# Altium footprint library Connector.PcbLib: 129 footprints (part 7 of 9)
Each footprint in its own frame and in the unit in brackets; x right, y up, seen from the top. Pads: shape width x height; smd on the part's side, far side on the other; paste and mask are expansions set on the pad; w line width, h text height; cw(c..) or ccw(c..) is an arc to the next point about the centre after c.
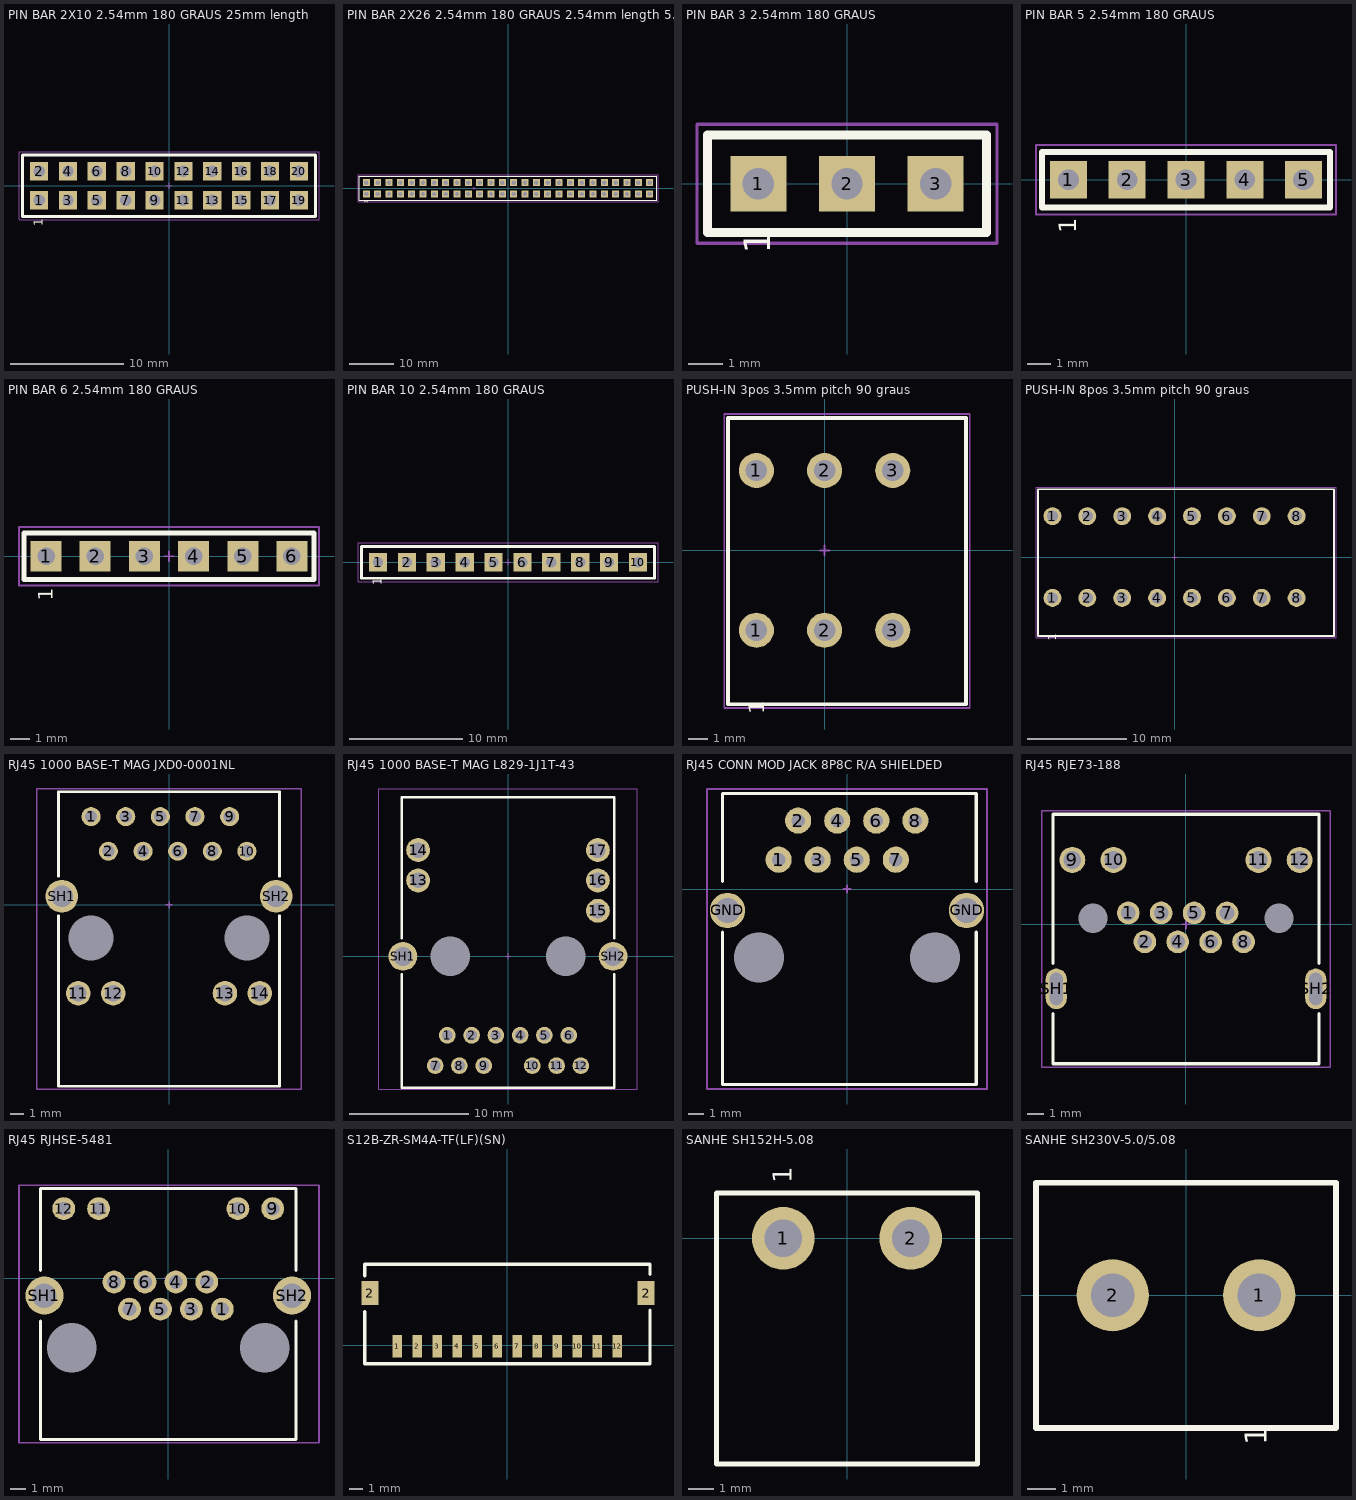
[diagram p6: the footprints below, top view; thin cyan lines are the x and y axes]

## PIN BAR 2X10 2.54mm 180 GRAUS 25mm length [mm] "HEADER 5 2.54mm 180 GRAUS"
height 25
pads (20):
  rect 1.6x1.6 hole 1: 1(-11.43,-1.27) 2(-11.43,1.27) 3(-8.89,-1.27) 4(-8.89,1.27) 5(-6.35,-1.27) 6(-6.35,1.27) 7(-3.81,-1.27) 8(-3.81,1.27) 9(-1.27,-1.27) 10(-1.27,1.27) 11(1.27,-1.27) 12(1.27,1.27) 13(3.81,-1.27) 14(3.81,1.27) 15(6.35,-1.27) 16(6.35,1.27) 17(8.89,-1.27) 18(8.89,1.27) 19(11.43,-1.27) 20(11.43,1.27)
Top Overlay:
  lines w0.254: -12.9,-2.7 -12.9,2.7 12.9,2.7 12.9,-2.7 -12.9,-2.7
  text "1" at -11.09,-3.57 h0.76
Mechanical 15:
  lines w0.1: -0.25,0 0.25,0 ; 0,-0.25 0,0.25 ; -13.2,-3 -13.2,3 13.2,3 13.2,-3 -13.2,-3
3D body "Pin Bar 2X10 2.54mm 25mm length.STEP": height 22.1, standoff -2.9, extent -12.7,-2.55 12.7,2.53

## PIN BAR 2X26 2.54mm 180 GRAUS 2.54mm length 5.84 contacts lenght [mm]
height 8.38
pads (52):
  rect 1.6x1.6 hole 1: 1(-31.75,-1.27) 2(-31.75,1.27) 3(-29.21,-1.27) 4(-29.21,1.27) 5(-26.67,-1.27) 6(-26.67,1.27) 7(-24.13,-1.27) 8(-24.13,1.27) 9(-21.59,-1.27) 10(-21.59,1.27) 11(-19.05,-1.27) 12(-19.05,1.27) 13(-16.51,-1.27) 14(-16.51,1.27) 15(-13.97,-1.27) 16(-13.97,1.27) 17(-11.43,-1.27) 18(-11.43,1.27) 19(-8.89,-1.27) 20(-8.89,1.27) 21(-6.35,-1.27) 22(-6.35,1.27) 23(-3.81,-1.27) 24(-3.81,1.27) 25(-1.27,-1.27) 26(-1.27,1.27) 27(1.27,-1.27) 28(1.27,1.27) 29(3.81,-1.27) 30(3.81,1.27) 31(6.35,-1.27) 32(6.35,1.27) 33(8.89,-1.27) 34(8.89,1.27) 35(11.43,-1.27) 36(11.43,1.27) 37(13.97,-1.27) 38(13.97,1.27) 39(16.51,-1.27) 40(16.51,1.27) 41(19.05,-1.27) 42(19.05,1.27) 43(21.59,-1.27) 44(21.59,1.27) 45(24.13,-1.27) 46(24.13,1.27) 47(26.67,-1.27) 48(26.67,1.27) 49(29.21,-1.27) 50(29.21,1.27) 51(31.75,-1.27) 52(31.75,1.27)
Top Overlay:
  lines w0.254: -33.32,-2.7 -33.32,2.7 33.32,2.7 33.32,-2.7 -33.32,-2.7
  text "1" at -31.4,-3.3 h0.76
Mechanical 15:
  lines w0.1: -7.87,0 -7.37,0 ; -7.62,-0.25 -7.62,0.25 ; -33.62,-3 -33.62,3 33.62,3 33.62,-3 -33.62,-3
3D body "TSW-126-07-G-D.stp": height 8.38, standoff -2.54, extent -33.02,-2.54 33.02,2.54

## PIN BAR 3 2.54mm 180 GRAUS [mm] "PIN BAR 3 2.54mm 180 GRAUS"
height 8.64
pads (3):
  rect 1.6x1.6 hole 0.9: 1(-2.54,0) 2(0,0) 3(2.54,0)
Top Overlay:
  lines w0.254: -4,-1.4 -4,1.4 4,1.4 4,-1.4 -4,-1.4
  text "1" at -2.2,-2 h0.76
Mechanical 15:
  lines w0.1: -0.25,0 0.25,0 ; 0,-0.25 0,0.25 ; -4.3,-1.7 -4.3,1.7 4.3,1.7 4.3,-1.7 -4.3,-1.7
3D body "User Library-Header_Male_3Pin.STEP": height 8.54, standoff -3, extent -3.81,-1.245 3.81,1.245

## PIN BAR 5 2.54mm 180 GRAUS [mm] "HEADER 5 2.54mm 180 GRAUS"
height 8.64
pads (5):
  rect 1.6x1.6 hole 0.9: 1(-5.08,0) 2(-2.54,0) 3(0,0) 4(2.54,0) 5(5.08,0)
Top Overlay:
  lines w0.254: -6.21,-1.2 -6.21,1.2 6.223,1.2 6.223,-1.2 -6.21,-1.2
  text "1" at -4.74,-2.3 h0.76
Mechanical 15:
  lines w0.1: -0.25,0 0.25,0 ; 0,-0.25 0,0.25 ; -6.477,-1.5 -6.477,1.5 6.477,1.5 6.477,-1.5 -6.477,-1.5
3D body "User Library-Header_Male_5Pin.STEP": height 8.64, standoff -2.9, extent -6.35,-1.25 6.35,1.24

## PIN BAR 6 2.54mm 180 GRAUS [mm] "HEADER 6 2.54mm 180 GRAUS"
height 8.64
pads (6):
  rect 1.6x1.6 hole 0.9: 1(-6.35,0) 2(-3.81,0) 3(-1.27,0) 4(1.27,0) 5(3.81,0) 6(6.35,0)
Top Overlay:
  lines w0.254: -7.48,-1.2 7.493,-1.2 7.493,1.2 -7.48,1.2 -7.48,-1.2
  text "1" at -6.01,-2.3 h0.76
Mechanical 15:
  lines w0.1: -0.25,0 0.25,0 ; 0,-0.25 0,0.25 ; -7.747,-1.5 -7.747,1.5 7.747,1.5 7.747,-1.5 -7.747,-1.5
3D body "User Library-Header_Male_6Pin.STEP": height 8.64, standoff -2.9, extent -7.62,-1.25 7.62,1.24

## PIN BAR 10 2.54mm 180 GRAUS [mm] "PIN BAR 10 2.54mm 180 GRAUS"
height 8.64
pads (10):
  rect 1.6x1.6 hole 0.9: 1(-11.43,0) 2(-8.89,0) 3(-6.35,0) 4(-3.81,0) 5(-1.27,0) 6(1.27,0) 7(3.81,0) 8(6.35,0) 9(8.89,0) 10(11.43,0)
Top Overlay:
  lines w0.254: -12.9,-1.4 12.9,-1.4 12.9,1.4 -12.9,1.4 -12.9,-1.4
  text "1" at -11.1,-2 h0.76
Mechanical 15:
  lines w0.1: -0.25,0 0.25,0 ; 0,-0.25 0,0.25 ; -13.2,-1.7 13.2,-1.7 13.2,1.7 -13.2,1.7 -13.2,-1.7
3D body "User Library-Header_Male_10Pin.STEP": height 8.54, standoff -3, extent -12.7,-1.245 12.7,1.245

## PUSH-IN 3pos 3.5mm pitch 90 graus [mm]
pads (6):
  round 1.8 hole 1.1: 1(-3.5,-4.1) 1(-3.5,4.1) 2(0,-4.1) 2(0,4.1) 3(3.5,-4.1) 3(3.5,4.1)
Top Overlay:
  lines w0.2: -4.95,-7.9 -4.95,6.8 7.25,6.8 7.25,-7.9 -4.95,-7.9
  text "1" at -3.11,-8.4 h0.8
Mechanical 15:
  lines w0.1: -0.25,0 0.25,0 ; 0,-0.25 0,0.25 ; -5.15,-8.1 7.45,-8.1 7.45,7 -5.15,7 -5.15,-8.1
3D body "1990740_00.STEP": height 13.5, standoff -2.5, extent -4.8,-7.7 7.1,6.7

## PUSH-IN 8pos 3.5mm pitch 90 graus [mm]
pads (16):
  round 1.8 hole 1.1: 1(-12.25,-4.1) 1(-12.25,4.1) 2(-8.75,-4.1) 2(-8.75,4.1) 3(-5.25,-4.1) 3(-5.25,4.1) 4(-1.75,-4.1) 4(-1.75,4.1) 5(1.75,-4.1) 5(1.75,4.1) 6(5.25,-4.1) 6(5.25,4.1) 7(8.75,-4.1) 7(8.75,4.1) 8(12.25,-4.1) 8(12.25,4.1)
Top Overlay:
  lines w0.2: -13.7,-7.9 16,-7.9 16,6.8 -13.7,6.8 -13.7,-7.9
  text "1" at -11.86,-8.4 h0.8
Mechanical 15:
  lines w0.1: -0.25,0 0.25,0 ; 0,-0.25 0,0.25 ; -13.9,-8.1 -13.9,7 16.2,7 16.2,-8.1 -13.9,-8.1
3D body "1990795_00.STEP": height 13.49, standoff -2.51, extent -13.55,-7.753 15.85,6.647

## RJ45 1000 BASE-T MAG JXD0-0001NL [mm]
height 13.65
pads (18):
  round 0 hole 3.3 unplated: 0(-5.715,-2.415) 0(5.715,-2.415)
  round 1.4 hole 0.9: 1(-5.715,6.475) 2(-4.445,3.935) 3(-3.175,6.475) 4(-1.905,3.935) 5(-0.635,6.475) 6(0.635,3.935) 7(1.905,6.475) 8(3.175,3.935) 9(4.445,6.475) 10(5.715,3.935)
  round 1.8 hole 1.2: 11(-6.645,-6.475) 12(-4.095,-6.475) 13(4.105,-6.475) 14(6.655,-6.475)
  round 2.4 hole 1.6: SH1(-7.855,0.635) SH2(7.855,0.635)
Top Overlay:
  lines w0.2: -8.1,-0.8 -8.1,-13.3 8.1,-13.3 8.1,-0.8 ; -8.1,2.1 -8.1,8.3 8.1,8.3 8.1,2.1
Mechanical 15:
  lines w0.1: -0.25,0 0.25,0 ; 0,-0.25 0,0.25 ; -9.7,-13.5 -9.7,8.5 9.7,8.5 9.7,-13.5 -9.7,-13.5
3D body "JXD0-0001NL.STEP": height 15.48, standoff -3.4, extent -9.63,-13.403 9.63,8.2

## RJ45 1000 BASE-T MAG L829-1J1T-43 [mm]
height 11.18
pads (21):
  round 0 hole 3.3 unplated: 0(-4.826,0) 0(4.826,0)
  round 1.4 hole 0.9: 1(-5.08,-6.604) 2(-3.048,-6.604) 3(-1.016,-6.604) 4(1.016,-6.604) 5(3.048,-6.604) 6(5.08,-6.604) 7(-6.096,-9.144) 8(-4.064,-9.144) 9(-2.032,-9.144) 10(2.032,-9.144) 11(4.064,-9.144) 12(6.096,-9.144)
  round 2 hole 1.3: 13(-7.518,6.35) 14(-7.518,8.89) 15(7.518,3.81) 16(7.518,6.35) 17(7.518,8.89)
  round 2.4 hole 1.6: SH1(-8.788,0) SH2(8.788,0)
Top Overlay:
  lines w0.2: -8.9,-1.5 -8.9,-11 8.9,-11 8.9,-1.5 ; -8.9,1.5 -8.9,13.3 8.9,13.3 8.9,1.5
Mechanical 15:
  lines w0.1: -0.25,0 0.25,0 ; 0,-0.25 0,0.25 ; -10.8,-11.1 -10.8,14 10.8,14 10.8,-11.1 -10.8,-11.1
3D body "User Library-BEL FUSE L829-1J1T-43.STEP": height 12.52, standoff -3.85, extent -10.175,-10.846 10.176,13.716

## RJ45 CONN MOD JACK 8P8C R/A SHIELDED [mm] "Jack Modular Connector 8p8c (RJ45, Ethernet) 90° Angle (Right) Shielded Cat5"
height 11.75
pads (12):
  round 0 hole 3.25 unplated: 0(-5.715,-4.445) 0(5.715,-4.445)
  round 1.7 hole 0.89: 1(-4.445,1.905) 2(-3.175,4.445) 3(-1.905,1.905) 4(-0.635,4.445) 5(0.635,1.905) 6(1.905,4.445) 7(3.175,1.905) 8(4.445,4.445)
  round 2.3 hole 1.6: GND(-7.77,-1.395) GND(7.77,-1.395)
Top Overlay:
  lines w0.2: -8.1,-2.8 -8.1,-12.7 8.4,-12.7 8.4,-2.8 ; -8.1,0.5 -8.1,6.2 8.4,6.2 8.4,0.5
Mechanical 15:
  lines w0.1: -0.25,0 0.25,0 ; 0,-0.25 0,0.25 ; -9.1,-13 9.1,-13 9.1,6.5 -9.1,6.5 -9.1,-13
3D body "MD_09455511102-2.STEP": height 11.74, standoff -3.21, extent -8.015,-12.545 7.925,6.105

## RJ45 RJE73-188 [mm]
height 11.25
pads (16):
  round 0 hole 1.8 unplated: 0(-5.74,0.375) 0(5.74,0.375)
  round 1.4 hole 0.9: 1(-3.56,0.705) 2(-2.54,-1.075) 3(-1.53,0.705) 4(-0.51,-1.075) 5(0.5,0.705) 6(1.52,-1.075) 7(2.53,0.705) 8(3.55,-1.075)
  round 1.6 hole 1.1: 9(-7.01,3.975) 10(-4.47,3.975) 11(4.47,3.975) 12(7.01,3.975)
  oval 1.3x2.5 hole 0.8 slot 2 at 90 deg: SH1(-8,-3.975) SH2(8,-3.975)
Top Overlay:
  lines w0.2: -8.2,-5.5 -8.2,-8.6 8.2,-8.6 8.2,-5.5 ; -8.2,-2.4 -8.2,6.8 8.2,6.8 8.2,-2.4
Mechanical 15:
  lines w0.1: -0.25,0 0.25,0 ; 0,-0.25 0,0.25 ; -8.9,-8.8 -8.9,7 8.9,7 8.9,-8.8 -8.9,-8.8
3D body "ACC-M-RJE73-188-00XX0-REVT1.STEP": height 11.54, standoff -2.04, extent -8.07,-8.619 8.07,6.63

## RJ45 RJHSE-5481 [mm]
height 13.46
pads (16):
  round 0 hole 3.25 unplated: 0(-6.35,-4.57) 0(6.35,-4.57)
  round 1.5 hole 0.9: 1(3.55,-2.03) 2(2.53,-0.25) 3(1.52,-2.03) 4(0.5,-0.25) 5(-0.51,-2.03) 6(-1.53,-0.25) 7(-2.54,-2.03) 8(-3.56,-0.25) 9(6.86,4.57) 10(4.57,4.57) 11(-4.57,4.57) 12(-6.86,4.57)
  round 2.5 hole 1.6: SH1(-8.13,-1.14) SH2(8.13,-1.14)
Top Overlay:
  lines w0.2: -8.4,-2.8 -8.4,-10.6 8.4,-10.6 8.4,-2.8 ; -8.4,0.5 -8.4,5.9 8.4,5.9 8.4,0.5
Mechanical 15:
  lines w0.1: -0.25,0 0.25,0 ; 0,-0.25 0,0.25 ; -9.8,-10.8 9.9,-10.8 9.9,6.1 -9.8,6.1 -9.8,-10.8
3D body "M-RJHSE-548X-REVT1.STEP": height 15.07, standoff -3.78, extent -9.803,-10.543 9.903,5.875

## S12B-ZR-SM4A-TF(LF)(SN) [mm]
pads (14):
  rect 0.7x1.7 smd: 1(-8.25,-0.1) 2(-6.75,-0.1) 3(-5.25,-0.1) 4(-3.75,-0.1) 5(-2.25,-0.1) 6(-0.75,-0.1) 7(0.75,-0.1) 8(2.25,-0.1) 9(3.75,-0.1) 10(5.25,-0.1) 11(6.75,-0.1) 12(8.25,-0.1)
  rect 1.25x1.8 smd: 2(-10.3,3.9) 2(10.4,3.9)
Top Overlay:
  lines w0.254: -10.7,2.5 -10.7,-1.4 10.7,-1.4 10.7,2.6 ; -10.7,5.2 -10.7,6.053 -9.5,6.053 ; -9.8,6.047 10.7,6.047 10.7,5.3
3D body "S12B-ZR-SM4A-TF.STEP": height 3.7, standoff 0, extent -10.5,-0.65 10.5,5.85

## SANHE SH152H-5.08 [mm]
pads (2):
  round 2.5 hole 1.5: 1(-2.54,0) 2(2.54,0)
Top Overlay:
  lines w0.2: -5.2,-9 5.2,-9 5.2,1.8 -5.2,1.8 -5.2,-9
  text "1" at -2.2,2.2 h0.76
3D body "Sanhe SH152H-5.08 2x5.08mm.STEP": height 31.5, standoff -4.9, extent -5.08,-9.5 5.08,1.7

## SANHE SH230V-5.0/5.08 [mm]
pads (2):
  round 2.5 hole 1.5: 1(2.54,0) 2(-2.54,0)
Top Overlay:
  lines w0.2: -5.2,-4.6 -5.2,3.9 5.2,3.9 5.2,-4.6 -3.3,-4.6 -5.2,-4.6
  text "1" at 2.8,-5.2 h0.76
3D body "Terminal Block 2x5.08mm.STEP": height 12.1, standoff -4.5, extent -5.08,-4.45 5.08,3.75